# Altium footprint library ZLS_Lib.PcbLib: 157 footprints (part 9 of 10)
Each footprint in its own frame and in the unit in brackets; x right, y up, seen from the top. Pads: shape width x height; smd on the part's side, far side on the other; paste and mask are expansions set on the pad; w line width, h text height; cw(c..) or ccw(c..) is an arc to the next point about the centre after c.
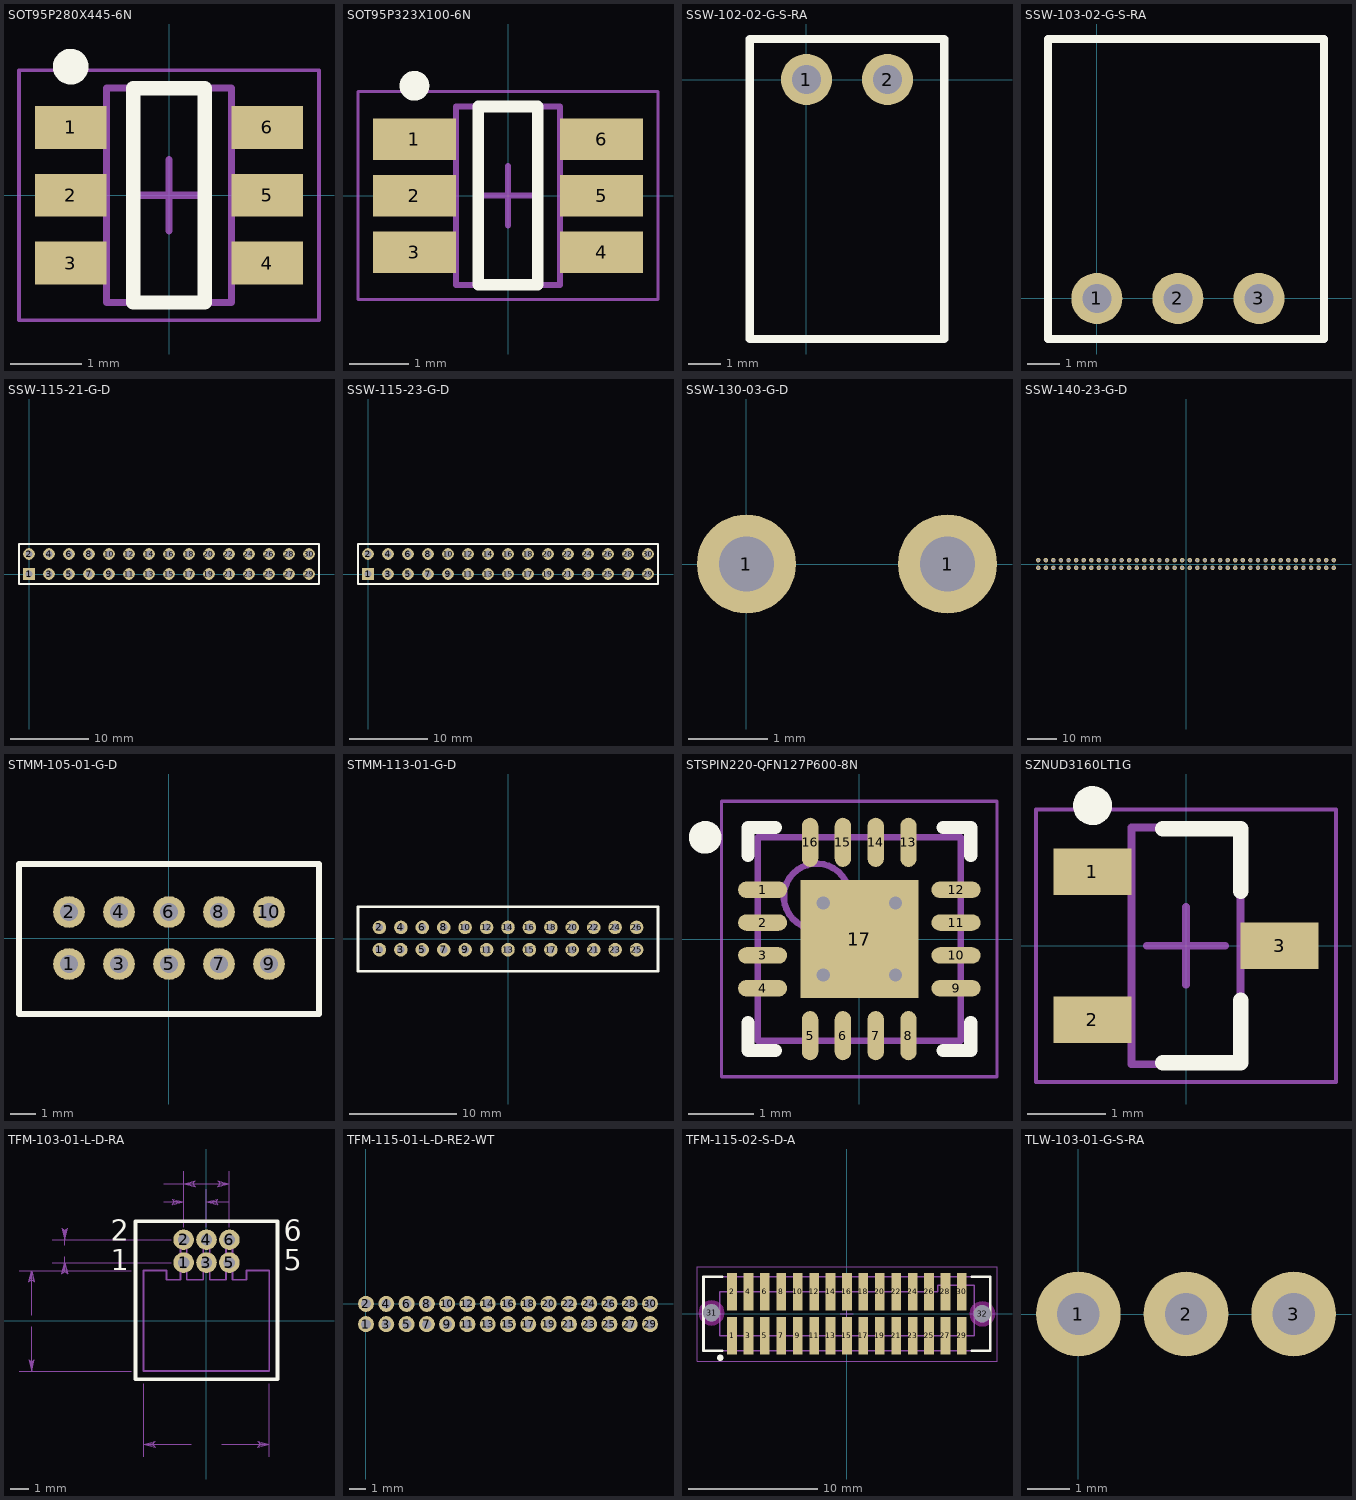
[diagram p8: the footprints below, top view; thin cyan lines are the x and y axes]

## SOT95P280X445-6N [mm] "SOT23, 6-Leads, Body 2.90x2.80mm, Pitch 0.95mm, IPC Medium Density"
height 0.584
pads (6):
  rect 1x0.6 smd: 1(-1.375,0.95) 2(-1.375,0) 3(-1.375,-0.95) 4(1.375,-0.95) 5(1.375,0) 6(1.375,0.95)
Top Overlay:
  circle w0.25: c-1.375,1.8 r0.125
  lines w0.2: -0.5,-1.5 0.5,-1.5 0.5,1.5 -0.5,1.5 -0.5,-1.5
Mechanical 13:
  lines w0.1: -0.875,-1.5 -0.875,1.5 0.875,1.5 0.875,-1.5 -0.875,-1.5
Mechanical 15:
  lines w0.05: -2.1,-1.75 -2.1,1.75 2.1,1.75 2.1,-1.75 -2.1,-1.75
  lines w0.1: -0.5,0 0.5,0 ; 0,-0.5 0,0.5
3D body: height 1.08, standoff 0, extent -2.108,-1.778 2.108,1.727

## SOT95P323X100-6N [mm] "SOT23, 6-Leads, Body 2.90x3.23mm, Pitch 0.95mm, IPC Medium Density"
height 1.079
pads (6):
  rect 1.4x0.7 smd: 1(-1.575,0.95) 2(-1.575,0) 3(-1.575,-0.95) 4(1.575,-0.95) 5(1.575,0) 6(1.575,0.95)
Top Overlay:
  circle w0.25: c-1.575,1.85 r0.125
  lines w0.2: -0.5,-1.5 -0.5,1.5 0.5,1.5 0.5,-1.5 -0.5,-1.5
Mechanical 13:
  lines w0.1: -0.875,-1.5 0.875,-1.5 0.875,1.5 -0.875,1.5 -0.875,-1.5
Mechanical 15:
  lines w0.05: -2.525,-1.75 2.525,-1.75 2.525,1.75 -2.525,1.75 -2.525,-1.75
  lines w0.1: -0.5,0 0.5,0 ; 0,-0.5 0,0.5
3D body: height 1, standoff 0, extent -1.925,-1.5 1.925,1.5

## SSW-102-02-G-S-RA [mm]
pads (2):
  round 1.6 hole 0.91: 1(0,0) 2(2.54,0)
Top Overlay:
  lines w0.254: -1.778,-8.128 -1.778,1.27 4.318,1.27 4.318,-8.128 -1.778,-8.128
3D body "_SSW_102_02_G_S_RA_terminal_2.sldprt": height 3.21, standoff 0.79, extent -1.524,-8.064 4.064,0.444
3D body "_SSW_102_02_G_S_RA_pin_4.sldprt": height 1.73, standoff -2.61, extent -0.521,-2.743 3.061,0

## SSW-103-02-G-S-RA [mm]
pads (3):
  round 1.6 hole 0.91: 1(0,0) 2(2.54,0) 3(5.08,0)
Top Overlay:
  lines w0.254: -1.524,-1.27 7.112,-1.27 7.112,8.128 -1.524,8.128 -1.524,-1.27
3D body "_SSW_103_02_G_S_RA_terminal_2.sldprt": height -0.79, standoff -3.21, extent -1.27,-0.444 6.858,8.064
3D body "_SSW_103_02_G_S_RA_pin_4.sldprt": height 1.73, standoff -2.61, extent -0.521,0 5.601,2.743

## SSW-115-21-G-D [mm]
pads (30):
  rect 1.5x1.5 hole 0.92: 1(0,0)
  round 1.5 hole 0.92: 2(0,2.54) 3(2.54,0) 4(2.54,2.54) 5(5.08,0) 6(5.08,2.54) 7(7.62,0) 8(7.62,2.54) 9(10.16,0) 10(10.16,2.54) 11(12.7,0) 12(12.7,2.54) 13(15.24,0) 14(15.24,2.54) 15(17.78,0) 16(17.78,2.54) 17(20.32,0) 18(20.32,2.54) 19(22.86,0) 20(22.86,2.54) 21(25.4,0) 22(25.4,2.54) 23(27.94,0) 24(27.94,2.54) 25(30.48,0) 26(30.48,2.54) 27(33.02,0) 28(33.02,2.54) 29(35.56,0) 30(35.56,2.54)
Top Overlay:
  lines w0.254: -1.27,-1.27 -1.27,3.81 36.83,3.81 36.83,-1.27 -1.27,-1.27
3D body "_T1SSW_115_23_G_D_2.sldprt": height 8.51, standoff 0, extent -1.524,-1.27 37.084,3.683
3D body "_P2SSW_115_21_G_D_4.sldprt": height 0.66, standoff -3, extent -0.521,-0.609 36.081,3.15

## SSW-115-23-G-D [mm]
height 0.216
pads (30):
  rect 1.5x1.5 hole 0.92: 1(0,0)
  round 1.5 hole 0.92: 2(0,2.54) 3(2.54,0) 4(2.54,2.54) 5(5.08,0) 6(5.08,2.54) 7(7.62,0) 8(7.62,2.54) 9(10.16,0) 10(10.16,2.54) 11(12.7,0) 12(12.7,2.54) 13(15.24,0) 14(15.24,2.54) 15(17.78,0) 16(17.78,2.54) 17(20.32,0) 18(20.32,2.54) 19(22.86,0) 20(22.86,2.54) 21(25.4,0) 22(25.4,2.54) 23(27.94,0) 24(27.94,2.54) 25(30.48,0) 26(30.48,2.54) 27(33.02,0) 28(33.02,2.54) 29(35.56,0) 30(35.56,2.54)
Top Overlay:
  lines w0.254: -1.27,-1.27 -1.27,3.81 36.83,3.81 36.83,-1.27 -1.27,-1.27
3D body "_T1SSW_115_23_G_D_2.sldprt": height 8.51, standoff 0, extent -1.524,-1.27 37.084,3.683
3D body "_P2SSW_115_23_G_D_4.sldprt": height 3.02, standoff -8, extent -0.521,-0.609 36.081,3.15

## SSW-130-03-G-D [mm]
height 8.51
pads (2):
  round 1.25 hole 0.7: 1(0,0) 1(2.54,0)

## SSW-140-23-G-D [mm]
pads (80):
  round 1.5 hole 0.92: 1(-49.53,-1.27) 2(-49.53,1.27) 3(-46.99,-1.27) 4(-46.99,1.27) 5(-44.45,-1.27) 6(-44.45,1.27) 7(-41.91,-1.27) 8(-41.91,1.27) 9(-39.37,-1.27) 10(-39.37,1.27) 11(-36.83,-1.27) 12(-36.83,1.27) 13(-34.29,-1.27) 14(-34.29,1.27) 15(-31.75,-1.27) 16(-31.75,1.27) 17(-29.21,-1.27) 18(-29.21,1.27) 19(-26.67,-1.27) 20(-26.67,1.27) 21(-24.13,-1.27) 22(-24.13,1.27) 23(-21.59,-1.27) 24(-21.59,1.27) 25(-19.05,-1.27) 26(-19.05,1.27) 27(-16.51,-1.27) 28(-16.51,1.27) 29(-13.97,-1.27) 30(-13.97,1.27) 31(-11.43,-1.27) 32(-11.43,1.27) 33(-8.89,-1.27) 34(-8.89,1.27) 35(-6.35,-1.27) 36(-6.35,1.27) 37(-3.81,-1.27) 38(-3.81,1.27) 39(-1.27,-1.27) 40(-1.27,1.27) 41(1.27,-1.27) 42(1.27,1.27) 43(3.81,-1.27) 44(3.81,1.27) 45(6.35,-1.27) 46(6.35,1.27) 47(8.89,-1.27) 48(8.89,1.27) 49(11.43,-1.27) 50(11.43,1.27) 51(13.97,-1.27) 52(13.97,1.27) 53(16.51,-1.27) 54(16.51,1.27) 55(19.05,-1.27) 56(19.05,1.27) 57(21.59,-1.27) 58(21.59,1.27) 59(24.13,-1.27) 60(24.13,1.27) 61(26.67,-1.27) 62(26.67,1.27) 63(29.21,-1.27) 64(29.21,1.27) 65(31.75,-1.27) 66(31.75,1.27) 67(34.29,-1.27) 68(34.29,1.27) 69(36.83,-1.27) 70(36.83,1.27) 71(39.37,-1.27) 72(39.37,1.27) 73(41.91,-1.27) 74(41.91,1.27) 75(44.45,-1.27) 76(44.45,1.27) 77(46.99,-1.27) 78(46.99,1.27) 79(49.53,-1.27) 80(49.53,1.27)
3D body "_P2SSW_140_23_G_D_4.sldprt": height 3.4, standoff -7.62, extent -50.051,-1.879 50.051,1.88
3D body "_T1SSW_140_23_G_D_2.sldprt": height 8.51, standoff 0, extent -51.054,-2.476 51.054,2.477

## STMM-105-01-G-D [mm]
height 4.8
pads (10):
  round 1.27 hole 0.71: 1(-4,-1.04) 2(-4,1.04) 3(-2,-1.04) 4(-2,1.04) 5(0,-1.04) 6(0,1.04) 7(2,-1.04) 8(2,1.04) 9(4,-1.04) 10(4,1.04)
Top Overlay:
  lines w0.254: -6,-3.04 -6,2.96 6,2.96 6,-3.04 -6,-3.04
3D body "_STMM_105_01_D__header_2.sldprt": height -1.2, standoff -6.03, extent -8.081,-3.523 8.081,3.015
3D body "_T_1S13_05_01_Dstmm_6.sldprt": height 5.19, standoff -1.34, extent -4.254,-1.254 4.254,1.254
3D body "_STMM_First_Position_Indicator_4.sldprt": height -1.2, standoff -1.45, extent -4.758,-4.52 -3.742,-3.25

## STMM-113-01-G-D [mm] "Headers & Wire Housings MGrid Hdr Shrd Vt 0. rd Vt 0.38AuLF 26Ckt"
height 4.8
pads (26):
  round 1.27 hole 0.71: 1(-12,-1.04) 2(-12,1.04) 3(-10,-1.04) 4(-10,1.04) 5(-8,-1.04) 6(-8,1.04) 7(-6,-1.04) 8(-6,1.04) 9(-4,-1.04) 10(-4,1.04) 11(-2,-1.04) 12(-2,1.04) 13(0,-1.04) 14(0,1.04) 15(2,-1.04) 16(2,1.04) 17(4,-1.04) 18(4,1.04) 19(6,-1.04) 20(6,1.04) 21(8,-1.04) 22(8,1.04) 23(10,-1.04) 24(10,1.04) 25(12,-1.04) 26(12,1.04)
Top Overlay:
  lines w0.254: -14,-3.04 -14,2.96 14,2.96 14,-3.04 -14,-3.04
3D body "_STMM_113_01_D__header_2.sldprt": height -1.2, standoff -6.03, extent -16.081,-3.523 16.081,3.015
3D body "_T_1S13_13_01_Dstmm_6.sldprt": height 5.19, standoff -1.34, extent -12.254,-1.254 12.254,1.254

## STSPIN220-QFN127P600-8N [mm]
height 1
pads (17):
  oval 0.75x0.25 smd: 1(-1.475,0.75) 2(-1.475,0.25) 3(-1.475,-0.25) 4(-1.475,-0.75) 9(1.475,-0.75) 10(1.475,-0.25) 11(1.475,0.25) 12(1.475,0.75)
  oval 0.25x0.75 smd: 5(-0.75,-1.475) 6(-0.25,-1.475) 7(0.25,-1.475) 8(0.75,-1.475) 13(0.75,1.475) 14(0.25,1.475) 15(-0.25,1.475) 16(-0.75,1.475)
  rect 1.8x1.8 smd: 17(0,0)
via 0.55,-0.55 diameter 0.5 hole 0.2
via -0.55,-0.55 diameter 0.5 hole 0.2
via 0.55,0.55 diameter 0.5 hole 0.2
via -0.55,0.55 diameter 0.5 hole 0.2
Top Overlay:
  circle w0.25: c-2.35,1.55 r0.125
  lines w0.2: -1.7,-1.275 -1.7,-1.7 -1.275,-1.7 ; -1.7,1.275 -1.7,1.7 -1.275,1.7 ; 1.275,-1.7 1.7,-1.7 1.7,-1.275 ; 1.275,1.7 1.7,1.7 1.7,1.275
Mechanical 13:
  circle w0.1: c-0.65,0.65 r0.5
  lines w0.1: -1.55,-1.55 1.55,-1.55 1.55,1.55 -1.55,1.55 -1.55,-1.55
Mechanical 15:
  lines w0.05: -2.1,-2.1 2.1,-2.1 2.1,2.1 -2.1,2.1 -2.1,-2.1
  lines w0.1: -0.5,0 0.5,0 ; 0,-0.5 0,0.5
3D body "STSPIN220-QFN127P600-8N.step": height 1, standoff 0, extent -1.6,-1.6 1.6,1.6

## SZNUD3160LT1G [mm]
height 1
pads (3):
  rect 1x0.6 smd: 1(-1.2,0.95) 2(-1.2,-0.95) 3(1.2,0)
Top Overlay:
  circle w0.25: c-1.2,1.8 r0.125
  lines w0.2: -0.3,-1.5 0.7,-1.5 0.7,-0.7 ; -0.3,1.5 0.7,1.5 0.7,0.7
Mechanical 13:
  lines w0.1: -0.7,-1.52 -0.7,1.52 0.7,1.52 0.7,-1.52 -0.7,-1.52
Mechanical 15:
  lines w0.05: -1.925,-1.75 -1.925,1.75 1.925,1.75 1.925,-1.75 -1.925,-1.75
  lines w0.1: -0.5,0 0.5,0 ; 0,-0.5 0,0.5
3D body "SZNUD3160LT1G.step": height 1, standoff 0, extent -1.32,-1.52 1.32,1.52

## TFM-103-01-L-D-RA [mil]
height 393.7
pads (6):
  round 45 hole 25: 1(-50,127.48) 2(-50,177.48) 3(0,127.48) 4(0,177.48) 5(50,127.48) 6(50,177.48)
Top Overlay:
  lines w7.87: -155.24,-127.72 -155.24,217.76 155.24,217.76 155.24,-127.72 -155.24,-127.72
  text "1" at -209.17,95.51 h77.5
  text "2" at -209.17,159.49 h77.5
  text "5" at 168.62,95.51 h77.5
  text "6" at 168.62,159.49 h77.5
Top Solder:
  circle w0: c-50,127.48 r24.51
  circle w0: c-50,177.48 r24.51
  circle w0: c0,127.48 r24.51
  circle w0: c0,177.48 r24.51
  circle w0: c50,127.48 r24.51
  circle w0: c50,177.48 r24.51
Bottom Solder:
  circle w0: c-50,127.48 r24.51
  circle w0: c-50,177.48 r24.51
  circle w0: c0,127.48 r24.51
  circle w0: c0,177.48 r24.51
  circle w0: c50,127.48 r24.51
  circle w0: c50,177.48 r24.51
Mechanical 16:
  lines w3.94: -137.48,-110 -25,-110 25,-110 137.48,-110 137.48,110 87.48,110 87.48,90 57.01,90 57.01,185 42.99,185 42.99,90 25,90 7.01,90 7.01,185 -7.01,185 -7.01,90 -25,90 -42.99,90 -42.99,185 -57.01,185 -57.01,90 -87.48,90 -87.48,110 -137.48,110 -137.48,-110
  text "1" at -209.17,95.51 h77.5
  text "2" at -209.17,159.49 h77.5
  text "5" at 168.62,95.51 h77.5
  text "6" at 168.62,159.49 h77.5
Mechanical 40:
  lines w0: -410.12,-110 -165.12,-110 ; -410.12,110 -165.12,110 ; -382.52,-12.52 -382.52,-110 ; -382.52,12.52 -382.52,110 ; -337.6,127.48 -77.6,127.48 ; -337.6,177.48 -77.6,177.48 ; -310,140 -310,127.48 ; -310,165 -310,177.48 ; -137.48,-297.6 -137.48,-137.6 ; -94.02,260 -50,260 ; -94.02,300 -50,300 ; -50,287.6 -50,205.12 -50,327.6 ; -33.5,-270 -137.48,-270 ; 0,205.12 0,287.6 ; 33.5,-270 137.48,-270 ; 50,205.12 50,327.6 ; 50,260 0,260 ; 137.48,-297.6 137.48,-137.6 ; -388.74,-85 -382.52,-110 ; -388.74,-85 -382.52,-90 ; -388.74,-85 -385.63,-87.48 -382.52,-110 ; -382.52,-110 -376.26,-85 -382.52,-90 ; -382.52,-110 -379.37,-87.48 -382.52,-90 ; -382.52,-110 -382.52,-90 ; -382.52,90 -388.74,85 -382.52,110 ; -382.52,90 -376.26,85 ; -382.52,90 -385.63,87.48 -382.52,110 ; -382.52,90 -382.52,110 ; -382.52,110 -376.26,85 ; -382.52,110 -379.37,87.48 -376.26,85 ; -316.26,202.52 -310,177.48 ; -316.26,202.52 -310,197.48 ; -316.26,202.52 -313.11,200 -310,177.48 ; -310,107.48 -316.26,102.52 -310,127.48 ; -310,107.48 -303.74,102.52 ; -310,107.48 -313.11,105 -310,127.48 ; -310,107.48 -310,127.48 ; -310,127.48 -303.74,102.52 ; -310,127.48 -306.89,105 -303.74,102.52 ; -310,177.48 -303.74,202.52 -310,197.48 ; -310,177.48 -306.89,200 -310,197.48 ; -310,177.48 -310,197.48 ; -137.48,-270 -112.52,-263.74 ; -137.48,-270 -112.52,-276.26 -117.48,-270 ; -137.48,-270 -115,-273.11 -117.48,-270 ; -137.48,-270 -117.48,-270 ; -137.48,-270 -115,-266.89 -112.52,-263.74 ; -117.48,-270 -112.52,-263.74 ; -75,253.74 -50,260 ; -75,253.74 -70,260 ; -75,253.74 -72.52,256.89 -50,260 ; -70,260 -75,266.26 -50,260 ; -70,260 -72.52,263.11 -50,260 ; -70,260 -50,260 ; -50,300 -25,306.26 ; -50,300 -25,293.74 -30,300 ; -50,300 -27.48,296.89 -30,300 ; -50,300 -30,300 ; -50,300 -27.48,303.11 -25,306.26 ; -50,300 50,300 ; -30,300 -25,306.26 ; 0,260 25,266.26 ; 0,260 25,253.74 20,260 ; 0,260 22.52,256.89 20,260 ; 0,260 20,260 ; 0,260 22.52,263.11 25,266.26 ; 20,260 25,266.26 ; 25,293.74 50,300 ; 25,293.74 30,300 ; 25,293.74 27.48,296.89 50,300 ; 30,300 25,306.26 50,300 ; 30,300 27.48,303.11 50,300 ; 30,300 50,300 ; 112.52,-276.26 137.48,-270 ; 112.52,-276.26 117.48,-270 ; 112.52,-276.26 115,-273.11 137.48,-270 ; 117.48,-270 112.52,-263.74 137.48,-270 ; 117.48,-270 115,-266.89 137.48,-270 ; 117.48,-270 137.48,-270
  text "5.588" at -408.5,-5 h15.5
  text "1.270" at -335.98,147.48 h15.5
  text "1.270" at -153.5,255 h15.5
  text "2.540" at -153.5,295 h15.5
  text "6.985" at -25.98,-275 h15.5
3D body "_TFM_103_01_L_D_RA_pins_4.sldprt": height 30.02, standoff -199.98, extent -75,-89.99 75,183.5
3D body "_TFM_103_01_L_D_RA_terminal_2.sldprt": height -44.98, standoff -269.98, extent -130,-90 145,130

## TFM-115-01-L-D-RE2-WT [mm]
height 16
pads (30):
  round 1 hole 0.6: 1(0,-1.27) 2(0,0) 3(1.27,-1.27) 4(1.27,0) 5(2.54,-1.27) 6(2.54,0) 7(3.81,-1.27) 8(3.81,0) 9(5.08,-1.27) 10(5.08,0) 11(6.35,-1.27) 12(6.35,0) 13(7.62,-1.27) 14(7.62,0) 15(8.89,-1.27) 16(8.89,0) 17(10.16,-1.27) 18(10.16,0) 19(11.43,-1.27) 20(11.43,0) 21(12.7,-1.27) 22(12.7,0) 23(13.97,-1.27) 24(13.97,0) 25(15.24,-1.27) 26(15.24,0) 27(16.51,-1.27) 28(16.51,0) 29(17.78,-1.27) 30(17.78,0)
3D body "_TFM_115_01_L_D_RE2_WT_terminal_2.sldprt": height -0.69, standoff -9.86, extent -3.975,0.889 21.755,6.985
3D body "_TFM_115_01_L_D_RE2_pins_4.sldprt": height -0.59, standoff -8.08, extent -0.635,-1.537 18.415,5.969

## TFM-115-02-S-D-A [mm]
pads (32):
  rect 0.75x2.9 smd mask+0: 1(-8.89,-1.714) 2(-8.89,1.714) 3(-7.62,-1.714) 4(-7.62,1.714) 5(-6.35,-1.714) 6(-6.35,1.714) 7(-5.08,-1.714) 8(-5.08,1.714) 9(-3.81,-1.714) 10(-3.81,1.714) 11(-2.54,-1.714) 12(-2.54,1.714) 13(-1.27,-1.714) 14(-1.27,1.714) 15(0,-1.714) 16(0,1.714) 17(1.27,-1.714) 18(1.27,1.714) 19(2.54,-1.714) 20(2.54,1.714) 21(3.81,-1.714) 22(3.81,1.714) 23(5.08,-1.714) 24(5.08,1.714) 25(6.35,-1.714) 26(6.35,1.714) 27(7.62,-1.714) 28(7.62,1.714) 29(8.89,-1.714) 30(8.89,1.714)
  round 1 hole 1.35 unplated mask+0: 31(-10.477,0.076) 32(10.477,0)
Top Overlay:
  circle w0.25: c-9.8,-3.4 r0.125
  lines w0.2: -9.65,-2.85 -11.1,-2.85 -11.1,2.85 -9.65,2.85 ; 9.65,-2.85 11.1,-2.85 11.1,2.85 9.65,2.85
Keep-Out Layer:
  pour cut-out: 11.461,0 11.428,0.255 11.329,0.492 11.173,0.695 10.969,0.852 10.732,0.95 10.478,0.983 10.223,0.95 9.986,0.852 9.782,0.695 9.626,0.492 9.528,0.255 9.494,0 9.528,-0.255 9.626,-0.492 9.782,-0.695 9.986,-0.852 10.223,-0.95 10.478,-0.983 10.732,-0.95 10.969,-0.852 11.173,-0.695 11.329,-0.492 11.428,-0.255
  pour cut-out: -9.494,0.076 -9.528,0.331 -9.626,0.568 -9.782,0.772 -9.986,0.928 -10.223,1.026 -10.478,1.06 -10.732,1.026 -10.969,0.928 -11.173,0.772 -11.329,0.568 -11.428,0.331 -11.461,0.076 -11.428,-0.178 -11.329,-0.415 -11.173,-0.619 -10.969,-0.775 -10.732,-0.874 -10.478,-0.907 -10.223,-0.874 -9.986,-0.775 -9.782,-0.619 -9.626,-0.415 -9.528,-0.178
Mechanical 12:
  lines w0.001: -11.1,-2.85 -11.1,2.85 11.1,2.85 11.1,-2.85 -11.1,-2.85 ; -9.83,-1.702 -9.83,1.702 7.036,1.702 7.036,2.21 9.83,2.21 9.83,-1.702 -9.83,-1.702
Mechanical 13:
  lines w0.1: -11.1,-2.85 -11.1,2.85 11.1,2.85 11.1,-2.85 -11.1,-2.85 ; -9.83,-1.702 -9.83,1.702 7.036,1.702 7.036,2.21 9.83,2.21 9.83,-1.702 -9.83,-1.702
  text ".Designator" at -7.239,4.572 h1.52
Mechanical 15:
  lines w0.05: -0.5,0 0.5,0 ; 0,-0.5 0,0.5 ; -11.6,-3.683 -11.6,3.65 11.608,3.65 11.608,-3.683 -11.6,-3.683

## TLW-103-01-G-S-RA [mm]
height 1.52
pads (3):
  round 2 hole 1: 1(0,0) 2(2.54,0) 3(5.08,0)
3D body "_TLW_103_01_G_S_RA0_495_terminal_2.sldprt": height 1.52, standoff 0, extent -1.27,-1.245 6.35,1.245
3D body "_TLW_03_01_S_RA_4.sldprt": height 1.24, standoff -3.49, extent -0.381,-8.922 5.588,0.286